# Altium footprint library SomoPowerPackControl.PcbLib: 145 footprints (part 6 of 10)
Each footprint in its own frame and in the unit in brackets; x right, y up, seen from the top. Pads: shape width x height; smd on the part's side, far side on the other; paste and mask are expansions set on the pad; w line width, h text height; cw(c..) or ccw(c..) is an arc to the next point about the centre after c.
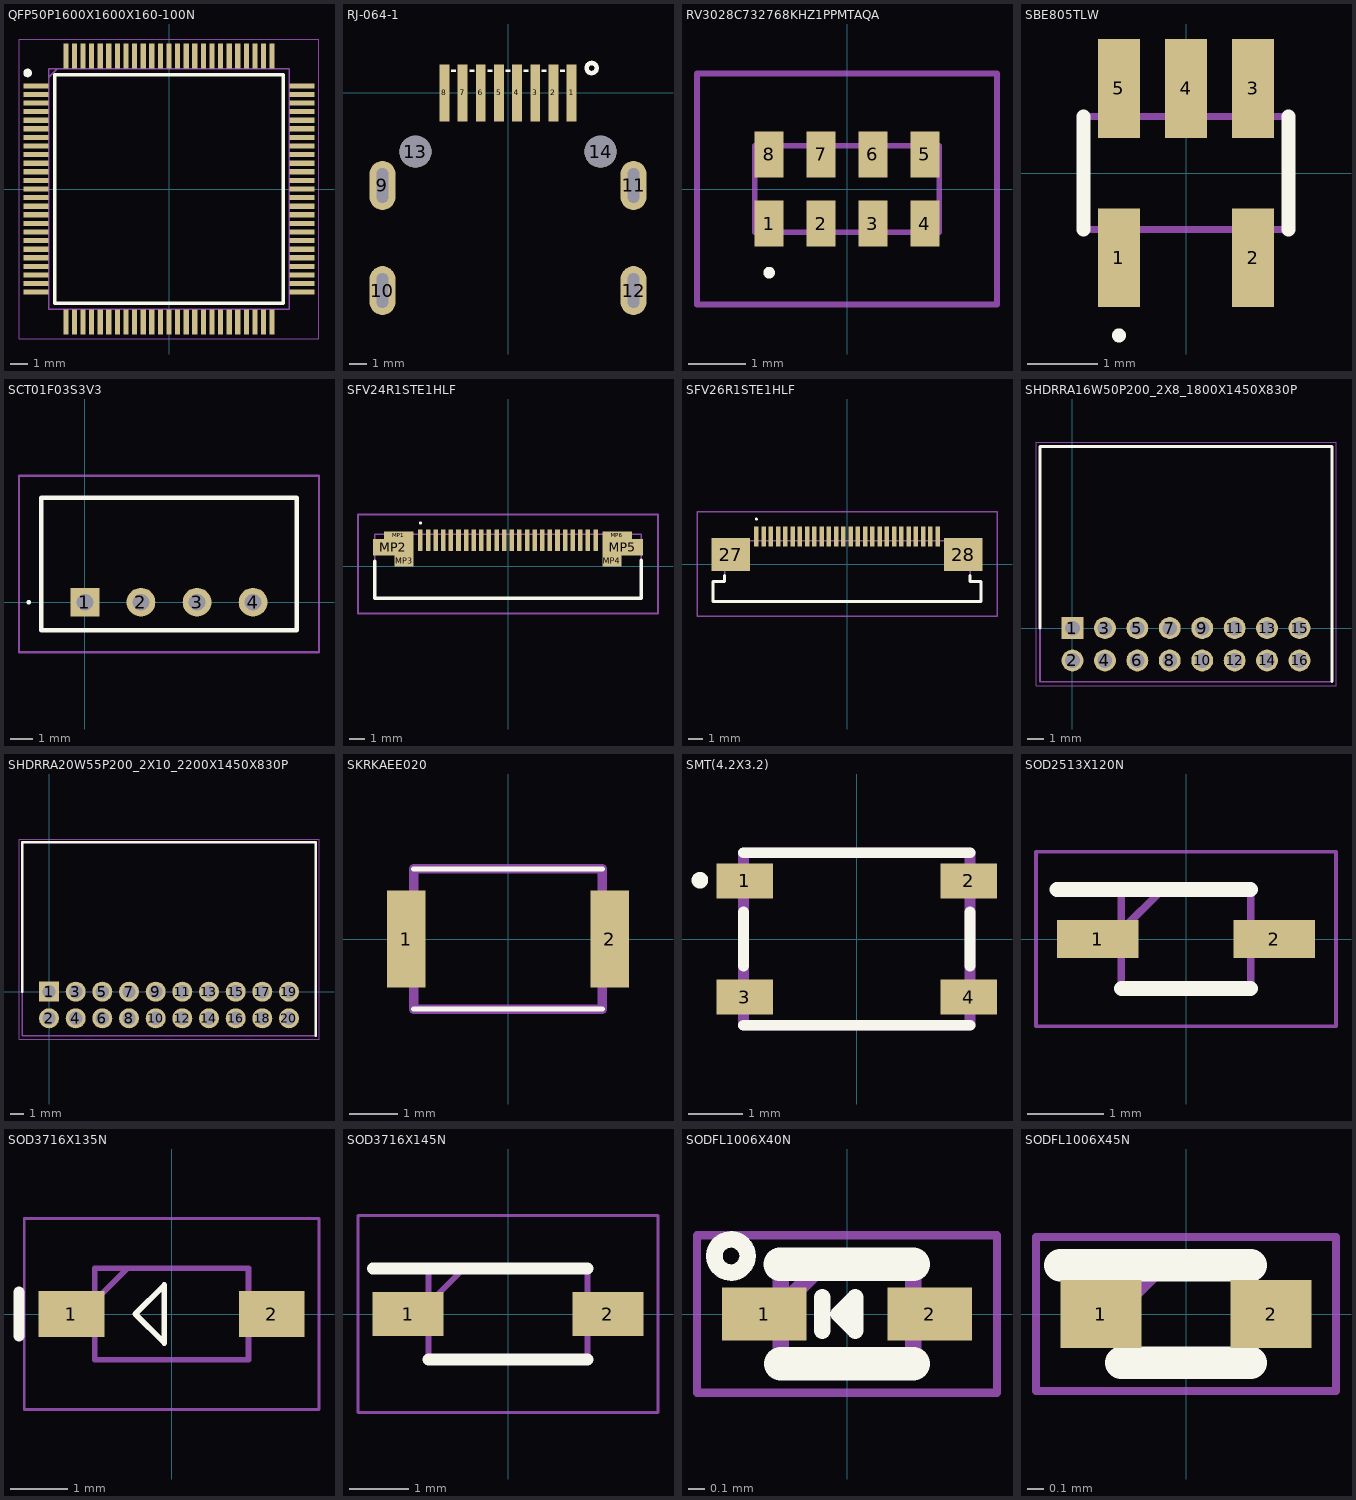
[diagram p5: the footprints below, top view; thin cyan lines are the x and y axes]

## QFP50P1600X1600X160-100N [mm]
pads (100):
  rect 1.475x0.3 smd: 1(-7.738,6) 2(-7.738,5.5) 3(-7.738,5) 4(-7.738,4.5) 5(-7.738,4) 6(-7.738,3.5) 7(-7.738,3) 8(-7.738,2.5) 9(-7.738,2) 10(-7.738,1.5) 11(-7.738,1) 12(-7.738,0.5) 13(-7.738,0) 14(-7.738,-0.5) 15(-7.738,-1) 16(-7.738,-1.5) 17(-7.738,-2) 18(-7.738,-2.5) 19(-7.738,-3) 20(-7.738,-3.5) 21(-7.738,-4) 22(-7.738,-4.5) 23(-7.738,-5) 24(-7.738,-5.5) 25(-7.738,-6) 51(7.738,-6) 52(7.738,-5.5) 53(7.738,-5) 54(7.738,-4.5) 55(7.738,-4) 56(7.738,-3.5) 57(7.738,-3) 58(7.738,-2.5) 59(7.738,-2) 60(7.738,-1.5) 61(7.738,-1) 62(7.738,-0.5) 63(7.738,0) 64(7.738,0.5) 65(7.738,1) 66(7.738,1.5) 67(7.738,2) 68(7.738,2.5) 69(7.738,3) 70(7.738,3.5) 71(7.738,4) 72(7.738,4.5) 73(7.738,5) 74(7.738,5.5) 75(7.738,6)
  rect 0.3x1.475 smd: 26(-6,-7.738) 27(-5.5,-7.738) 28(-5,-7.738) 29(-4.5,-7.738) 30(-4,-7.738) 31(-3.5,-7.738) 32(-3,-7.738) 33(-2.5,-7.738) 34(-2,-7.738) 35(-1.5,-7.738) 36(-1,-7.738) 37(-0.5,-7.738) 38(0,-7.738) 39(0.5,-7.738) 40(1,-7.738) 41(1.5,-7.738) 42(2,-7.738) 43(2.5,-7.738) 44(3,-7.738) 45(3.5,-7.738) 46(4,-7.738) 47(4.5,-7.738) 48(5,-7.738) 49(5.5,-7.738) 50(6,-7.738) 76(6,7.738) 77(5.5,7.738) 78(5,7.738) 79(4.5,7.738) 80(4,7.738) 81(3.5,7.738) 82(3,7.738) 83(2.5,7.738) 84(2,7.738) 85(1.5,7.738) 86(1,7.738) 87(0.5,7.738) 88(0,7.738) 89(-0.5,7.738) 90(-1,7.738) 91(-1.5,7.738) 92(-2,7.738) 93(-2.5,7.738) 94(-3,7.738) 95(-3.5,7.738) 96(-4,7.738) 97(-4.5,7.738) 98(-5,7.738) 99(-5.5,7.738) 100(-6,7.738)
Top Overlay:
  circle w0.25: c-8.225,6.75 r0.125
  lines w0.2: -6.65,-6.65 6.65,-6.65 6.65,6.65 -6.65,6.65 -6.65,-6.65
Mechanical 13:
  lines w0.1: -7,6.5 -6.5,7 ; -7,-7 7,-7 7,7 -7,7 -7,-7
Mechanical 15:
  lines w0.05: -8.725,-8.725 8.725,-8.725 8.725,8.725 -8.725,8.725 -8.725,-8.725
3D body "STM32G474VET6.stp": height 1.6, standoff 0, extent -8,-8 8,8

## RJ-064-1 [mm]
pads (14):
  rect 0.55x3.2 smd mask+0: 1(3.57,0) 2(2.55,0) 3(1.53,0) 4(0.501,0) 5(-0.501,0) 6(-1.53,0) 7(-2.55,0) 8(-3.57,0)
  oval 1.45x2.75 hole 0.65 slot 1.95 at 90 deg mask+0: 9(-7.05,-5.2) 10(-7.05,-11.1) 11(7.05,-5.2) 12(7.05,-11.1)
  round 1.8 hole 1.8 unplated mask+0: 13(-5.2,-3.3) 14(5.2,-3.3)
Top Overlay:
  circle w0.254: c4.699,1.397 r0.284
  region: 3.175,1.304 2.921,1.304 2.921,1.196 3.175,1.196
  region: 2.159,1.304 1.905,1.304 1.905,1.196 2.159,1.196
  region: 1.143,1.304 0.889,1.304 0.889,1.196 1.143,1.196
  region: 0.127,1.304 -0.127,1.304 -0.127,1.196 0.127,1.196
  region: -0.889,1.304 -1.143,1.304 -1.143,1.196 -0.889,1.196
  region: -1.905,1.304 -2.159,1.304 -2.159,1.196 -1.905,1.196
  region: -2.921,1.304 -3.175,1.304 -3.175,1.196 -2.921,1.196
3D body "FG RJ-064-1.STEP": height 10.75, standoff -1.9, extent -7.37,-14.15 7.37,1.15

## RV3028C732768KHZ1PPMTAQA [mm]
pads (8):
  rect 0.5x0.8 smd: 1(-1.35,-0.6) 2(-0.45,-0.6) 3(0.45,-0.6) 4(1.35,-0.6) 5(1.35,0.6) 6(0.45,0.6) 7(-0.45,0.6) 8(-1.35,0.6)
Top Overlay:
  lines w0.1: -1.35,-1.5 ccw(c-1.35,-1.45) -1.35,-1.4 ccw(c-1.35,-1.45) -1.35,-1.5
Mechanical 13:
  lines w0.1: -1.6,-0.75 -1.6,0.75 1.6,0.75 1.6,-0.75 -1.6,-0.75
Mechanical 15:
  lines w0.1: -2.6,-2 -2.6,2 2.6,2 2.6,-2 -2.6,-2
3D body "RV-3028-C7_32.768KHZ_1PPM-TA-QA.stp": height 0.9, standoff 0, extent -1.6,-0.95 1.6,0.95

## SBE805TLW [mm]
pads (5):
  rect 0.6x1.4 smd: 1(-0.95,-1.2) 2(0.95,-1.2) 3(0.95,1.2) 4(0,1.2) 5(-0.95,1.2)
Top Overlay:
  lines w0.1: -1,-2.3 ccw(c-0.95,-2.3) -0.9,-2.3 ccw(c-0.95,-2.3) -1,-2.3
  lines w0.2: -1.45,-0.8 -1.45,0.8 ; 1.45,-0.8 1.45,0.8
Mechanical 13:
  lines w0.1: -1.45,-0.8 1.45,-0.8 1.45,0.8 -1.45,0.8 -1.45,-0.8
3D body "CPH5520-TL-E.stp": height 1, standoff 0, extent -1.45,-1.84 1.45,1.84

## SCT01F03S3V3 [mm]
pads (4):
  rect 1.303x1.303 hole 0.76: 1(0,0)
  round 1.303 hole 0.76: 2(2.54,0) 3(5.08,0) 4(7.62,0)
Top Overlay:
  lines w0.1: -2.6,0 cw(c-2.55,0) -2.5,0 cw(c-2.55,0) -2.6,0
  lines w0.2: -1.99,-1.27 -1.99,4.73 9.61,4.73 9.61,-1.27 -1.99,-1.27
Mechanical 13:
  lines w0.1: -1.99,-1.27 -1.99,4.73 9.61,4.73 9.61,-1.27 -1.99,-1.27
Mechanical 15:
  lines w0.1: -2.99,-2.27 -2.99,5.73 10.61,5.73 10.61,-2.27 -2.99,-2.27
3D body "SCT01F03S3V3.stp": height 10.8, standoff -5, extent -1.99,-1.27 9.61,4.73

## SFV24R1STE1HLF [mm]
pads (30):
  rect 0.3x1.4 smd: 1(-5.75,1.7) 2(-5.25,1.7) 3(-4.75,1.7) 4(-4.25,1.7) 5(-3.75,1.7) 6(-3.25,1.7) 7(-2.75,1.7) 8(-2.25,1.7) 9(-1.75,1.7) 10(-1.25,1.7) 11(-0.75,1.7) 12(-0.25,1.7) 13(0.25,1.7) 14(0.75,1.7) 15(1.25,1.7) 16(1.75,1.7) 17(2.25,1.7) 18(2.75,1.7) 19(3.25,1.7) 20(3.75,1.7) 21(4.25,1.7) 22(4.75,1.7) 23(5.25,1.7) 24(5.75,1.7)
  rect 1.95x0.5 smd: MP1(-7.175,2.05) MP6(7.175,2.05)
  rect 2.65x1.1 smd: MP2(-7.525,1.25) MP5(7.525,1.25)
  rect 1.25x0.7 smd: MP3(-6.825,0.35) MP4(6.825,0.35)
Top Overlay:
  lines w0.1: -5.75,2.8 cw(c-5.75,2.85) -5.75,2.9 cw(c-5.75,2.85) -5.75,2.8
  lines w0.2: -8.75,0.35 -8.75,-2.1 8.75,-2.1 8.75,0.4
Mechanical 13:
  lines w0.1: -8.75,-2.1 -8.75,2.1 8.75,2.1 8.75,-2.1 -8.75,-2.1
Mechanical 15:
  lines w0.1: -9.85,-3.1 -9.85,3.4 9.85,3.4 9.85,-3.1 -9.85,-3.1
3D body "SFV24R-1STE1HLF.stp": height 1.87, standoff 0, extent -8.75,-2.7 8.75,2.2

## SFV26R1STE1HLF [mm]
pads (28):
  rect 0.3x1.4 smd: 1(-6.25,1.9) 2(-5.75,1.9) 3(-5.25,1.9) 4(-4.75,1.9) 5(-4.25,1.9) 6(-3.75,1.9) 7(-3.25,1.9) 8(-2.75,1.9) 9(-2.25,1.9) 10(-1.75,1.9) 11(-1.25,1.9) 12(-0.75,1.9) 13(-0.25,1.9) 14(0.25,1.9) 15(0.75,1.9) 16(1.25,1.9) 17(1.75,1.9) 18(2.25,1.9) 19(2.75,1.9) 20(3.25,1.9) 21(3.75,1.9) 22(4.25,1.9) 23(4.75,1.9) 24(5.25,1.9) 25(5.75,1.9) 26(6.25,1.9)
  rect 2.65x2.3 smd: 27(-8.025,0.65) 28(8.025,0.65)
Top Overlay:
  lines w0.1: -6.25,3.05 cw(c-6.25,3.1) -6.25,3.15 cw(c-6.25,3.1) -6.25,3.05
  lines w0.2: -8.45,-0.8 -8.45,-1.2 -9.25,-1.2 -9.25,-2.6 9.25,-2.6 9.25,-1.2 8.5,-1.2 8.5,-0.8
Mechanical 13:
  lines w0.1: -9.25,-2.6 -9.25,-1.2 -8.45,-1.2 -8.45,1.6 8.45,1.6 8.5,-1.2 9.25,-1.2 9.25,-2.6 0,-2.6 -9.25,-2.6
Mechanical 15:
  lines w0.1: -10.35,-3.6 10.35,-3.6 10.35,3.6 -10.35,3.6 -10.35,-3.6
3D body "SFV26R-1STE1HLF.stp": height 2.1, standoff 0, extent -9.25,-2.6 9.25,2.57

## SHDRRA16W50P200_2X8_1800X1450X830P [mm]
pads (16):
  rect 1.35x1.35 hole 0.9: 1(0,0)
  round 1.35 hole 0.9: 2(0,-2) 3(2,0) 4(2,-2) 5(4,0) 6(4,-2) 7(6,0) 8(6,-2) 9(8,0) 10(8,-2) 11(10,0) 12(10,-2) 13(12,0) 14(12,-2) 15(14,0) 16(14,-2)
Top Overlay:
  lines w0.2: -2,0 -2,11.2 16,11.2 16,-3.3
Mechanical 13:
  lines w0.1: -2,-3.3 16,-3.3 16,11.2 -2,11.2 -2,-3.3
Mechanical 15:
  lines w0.05: -2.25,-3.55 16.25,-3.55 16.25,11.45 -2.25,11.45 -2.25,-3.55
3D body "501876-1640.stp": height 8.3, standoff -3.2, extent -2,-3.295 16,11.205

## SHDRRA20W55P200_2X10_2200X1450X830P [mm]
pads (20):
  rect 1.5x1.5 hole 1: 1(0,0)
  round 1.5 hole 1: 2(0,-2) 3(2,0) 4(2,-2) 5(4,0) 6(4,-2) 7(6,0) 8(6,-2) 9(8,0) 10(8,-2) 11(10,0) 12(10,-2) 13(12,0) 14(12,-2) 15(14,0) 16(14,-2) 17(16,0) 18(16,-2) 19(18,0) 20(18,-2)
Top Overlay:
  lines w0.2: -2,0 -2,11.2 20,11.2 20,-3.3
Mechanical 13:
  lines w0.1: -2,-3.3 20,-3.3 20,11.2 -2,11.2 -2,-3.3
Mechanical 15:
  lines w0.05: -2.25,-3.55 20.25,-3.55 20.25,11.45 -2.25,11.45 -2.25,-3.55
3D body "501876-2040.stp": height 8.3, standoff -3.2, extent -2,-3.295 20,11.205

## SKRKAEE020 [mm]
pads (2):
  rect 0.8x2 smd: 1(-2.1,0) 2(2.1,0)
Top Overlay:
  lines w0.1: -1.95,-1.45 1.95,-1.45 ; -1.95,1.45 1.95,1.45
Mechanical 13:
  lines w0.2: -1.95,-1.45 -1.95,1.45 1.95,1.45 1.95,-1.45 -1.95,-1.45
3D body "SKRKAEE020.stp": height 2, standoff 0, extent -2.4,-1.45 2.4,1.45

## SMT(4.2X3.2) [mm]
pads (4):
  rect 1.05x0.65 smd: 1(-2.075,1.075) 2(2.075,1.075) 3(-2.075,-1.075) 4(2.075,-1.075)
Top Overlay:
  circle w0.2: c-2.906,1.089 r0.053
  lines w0.2: -2.1,-1.6 2.1,-1.6 ; -2.1,-0.5 -2.1,0.5 ; -2.1,1.6 2.1,1.6 ; 2.1,-0.5 2.1,0.5
Mechanical 13:
  lines w0.2: -2.1,-1.6 2.1,-1.6 2.1,1.6 -2.1,1.6 -2.1,-1.6
3D body "SKRPACE010.stp": height 2.5, standoff 0, extent -2.3,-1.6 2.3,1.6

## SOD2513X120N [mm]
pads (2):
  rect 1.075x0.5 smd: 1(-1.162,0) 2(1.162,0)
Top Overlay:
  lines w0.2: -1.7,0.65 0.85,0.65 ; -0.85,-0.65 0.85,-0.65
Mechanical 13:
  lines w0.1: -0.85,0.112 -0.312,0.65 ; -0.85,-0.65 0.85,-0.65 0.85,0.65 -0.85,0.65 -0.85,-0.65
Mechanical 15:
  lines w0.05: -1.975,-1.15 1.975,-1.15 1.975,1.15 -1.975,1.15 -1.975,-1.15
3D body "1N4148WS-7-F.stp": height 1.11, standoff 0, extent -1.259,-0.65 1.259,0.65

## SOD3716X135N [mm]
pads (2):
  rect 1.15x0.8 smd: 1(-1.75,0) 2(1.75,0)
Top Overlay:
  lines w0.1: -0.635,0 -0.127,-0.508 -0.127,0.508 -0.635,0
  lines w0.2: -2.667,-0.381 -2.667,0.381
Mechanical 13:
  lines w0.1: -1.345,0.225 -0.77,0.8 ; -1.345,-0.8 1.345,-0.8 1.345,0.8 -1.345,0.8 -1.345,-0.8
Mechanical 15:
  lines w0.05: -2.575,-1.67 2.575,-1.67 2.575,1.67 -2.575,1.67 -2.575,-1.67
3D body "MMSZ4699T1G.stp": height 1.35, standoff 0, extent -1.855,-0.8 1.855,0.8

## SOD3716X145N [mm]
pads (2):
  rect 1.2x0.75 smd: 1(-1.7,0) 2(1.7,0)
Top Overlay:
  lines w0.2: -2.3,0.775 1.35,0.775 ; -1.35,-0.775 1.35,-0.775
Mechanical 13:
  lines w0.1: -1.35,0.175 -0.75,0.775 ; -1.35,-0.775 1.35,-0.775 1.35,0.775 -1.35,0.775 -1.35,-0.775
Mechanical 15:
  lines w0.05: -2.55,-1.675 2.55,-1.675 2.55,1.675 -2.55,1.675 -2.55,-1.675
3D body "BZT52C15-7-F.stp": height 1, standoff 0, extent -1.85,-0.89 1.85,0.89

## SODFL1006X40N [mm]
pads (2):
  rect 0.51x0.32 smd: 1(-0.5,0) 2(0.5,0)
Top Overlay:
  circle w0.1: c-0.7,0.35 r0.1
  lines w0.1: -0.15,-0.1 -0.15,0.1 ; -0.05,0 0.05,0.1 0.05,-0.1 -0.05,0
  lines w0.2: -0.405,0.3 0.4,0.3 ; -0.4,-0.3 0.4,-0.3
Mechanical 13:
  lines w0.1: -0.4,0.045 -0.145,0.3 ; -0.4,-0.3 0.4,-0.3 0.4,0.3 -0.4,0.3 -0.4,-0.3
Mechanical 15:
  lines w0.05: -0.905,-0.475 0.905,-0.475 0.905,0.475 -0.905,0.475 -0.905,-0.475
3D body "ESD9P5.0ST5G.stp": height 0.4, standoff 0, extent -0.5,-0.3 0.5,0.3

## SODFL1006X45N [mm]
pads (2):
  rect 0.5x0.42 smd: 1(-0.525,0) 2(0.525,0)
Top Overlay:
  lines w0.2: -0.775,0.3 0.4,0.3 ; -0.4,-0.3 0.4,-0.3
Mechanical 13:
  lines w0.1: -0.4,0.05 -0.15,0.3 ; -0.4,-0.3 -0.4,0.3 0.4,0.3 0.4,-0.3 -0.4,-0.3
Mechanical 15:
  lines w0.05: -0.925,-0.475 -0.925,0.475 0.925,0.475 0.925,-0.475 -0.925,-0.475
3D body "DF2S16FS,L3M.stp": height 0.4, standoff 0, extent -0.5,-0.3 0.5,0.3